# Altium footprint library Connectors THD.PcbLib: 631 footprints (part 40 of 46) (continued)
## TYCO_2-174225-5 [mm] "68 contacts, AMPLIMITE .050\", Right Angled Header  Series 2 Type B (Threaded  M2.5)"
height 9.5
pads (70):
  round 5.5 hole 2.8: 69(-28.955,-0.953) 70(28.955,-0.953)
  round 1.5 hole 0.9: A1(-20.955,2.858) A2(-19.685,0.953) A3(-18.415,2.858) A4(-17.145,0.953) A5(-15.875,2.858) A6(-14.605,0.953) A7(-13.335,2.858) A8(-12.065,0.952) A9(-10.795,2.858) A10(-9.525,0.953) A11(-8.255,2.858) A12(-6.985,0.953) A13(-5.715,2.858) A14(-4.445,0.953) A15(-3.175,2.858) A16(-1.905,0.953) A17(-0.635,2.858) A18(0.635,0.953) A19(1.905,2.858) A20(3.175,0.953) A21(4.445,2.858) A22(5.715,0.953) A23(6.985,2.858) A24(8.255,0.953) A25(9.525,2.858) A26(10.795,0.953) A27(12.065,2.858) A28(13.335,0.953) A29(14.605,2.858) A30(15.875,0.953) A31(17.145,2.858) A32(18.415,0.953) A33(19.685,2.858) A34(20.955,0.953) B1(-20.955,-0.953) B2(-19.685,-2.858) B3(-18.415,-0.953) B4(-17.145,-2.858) B5(-15.875,-0.953) B6(-14.605,-2.858) B7(-13.335,-0.953) B8(-12.065,-2.858) B9(-10.795,-0.953) B10(-9.525,-2.858) B11(-8.255,-0.953) B12(-6.985,-2.858) B13(-5.715,-0.953) B14(-4.445,-2.858) B15(-3.175,-0.953) B16(-1.905,-2.858) B17(-0.635,-0.953) B18(0.635,-2.858) B19(1.905,-0.953) B20(3.175,-2.858) B21(4.445,-0.953) B22(5.715,-2.858) B23(6.985,-0.953) B24(8.255,-2.858) B25(9.525,-0.953) B26(10.795,-2.858) B27(12.065,-0.953) B28(13.335,-2.858) B29(14.605,-0.953) B30(15.875,-2.858) B31(17.145,-0.953) B32(18.415,-2.858) B33(19.685,-0.953) B34(20.955,-2.858)
Top Overlay:
  circle w0.3: c-20.9,4.75 r0.15
  lines w0.2: -31.955,-6.658 -24.69,-6.658 -24.69,-7.658 -31.955,-7.658 -31.955,2.143 cw(c-29.955,2.143) -29.955,4.143 29.955,4.143 cw(c29.955,2.143) 31.955,2.143 31.955,-7.658 24.69,-7.658 24.69,-6.658 31.955,-6.658 ; -31.955,-4.658 31.955,-4.658 ; -26.055,-7.658 -26.055,-11.658 -26.855,-11.658 -26.855,-11.958 -26.055,-13.158 26.055,-13.158 26.855,-11.958 26.855,-11.658 26.055,-11.658 26.055,-7.658 ; -23.14,-4.658 -23.14,-3.5 ; -23.14,3.5 -23.14,4.143 ; -21.455,-13.158 -21.455,-11.158 cw(c-20.955,-11.158) -20.455,-11.158 -20.455,-13.158 ; -23.14,-7.658 -23.14,-6.658 23.14,-6.658 23.14,-7.658 -23.14,-7.658
  text "A34" at 22,0.485 h1
  text "B33" at 22,-1.415 h1
  text "B34" at 22,-3.365 h1
  text "A33" at 22,2.335 h1
  text "B2" at -23.25,-3.25 h1
  text "A1" at -23.25,2.25 h1
  text "A2" at -23.25,0.5 h1
  text "B1" at -23.25,-1.5 h1
Mechanical 8:
  drawing of 284 lines, arcs and shapes, not listed
Mechanical 14:
  drawing of 176 lines, arcs and shapes, not listed
  text "A34" at 22,0.485 h1.02
  text "B33" at 22,-1.415 h1.02
  text "B34" at 22,-3.365 h1.02
  text "A33" at 22,2.335 h1.02
  text "B2" at -23.25,-3.25 h1.02
  text "A1" at -23.25,2.25 h1.02
  text "A2" at -23.25,0.5 h1.02
  text "B1" at -23.25,-1.5 h1.02
3D body: height 9.5, standoff -2.9, extent -31.955,-13.157 31.955,4.143

## TYCO_2-1437506-7 [mm] "HOLTITE Socket (Mating Pin Dia. Range 0.64 to 0.89mm)"
height 3.56
pads (1):
  round 2.1 hole 1.5: 1(0,0)
Mechanical 14:
  circle w0.1: c0,0.006 r0.368
  circle w0.1: c0,0 r0.737
3D body: height 0, standoff -3.45, extent -0.736,-0.736 0.737,0.737

## TYCO_2-5174339-5 [mm] "68 contacts,AMPLIMITE .050 Series II Connector, Through-hole Vertical Plug"
height 9.3
pads (70):
  round 5.5 hole 2.8: 69(-28.956,0) 70(28.956,0)
  round 1.5 hole 0.8: A1(-20.955,2.858) A2(-19.685,0.953) A3(-18.415,2.858) A4(-17.145,0.953) A5(-15.875,2.858) A6(-14.605,0.953) A7(-13.335,2.858) A8(-12.065,0.952) A9(-10.795,2.858) A10(-9.525,0.953) A11(-8.255,2.858) A12(-6.985,0.953) A13(-5.715,2.858) A14(-4.445,0.953) A15(-3.175,2.858) A16(-1.905,0.953) A17(-0.635,2.858) A18(0.635,0.953) A19(1.905,2.858) A20(3.175,0.953) A21(4.445,2.858) A22(5.715,0.953) A23(6.985,2.858) A24(8.255,0.953) A25(9.525,2.858) A26(10.795,0.953) A27(12.065,2.858) A28(13.335,0.953) A29(14.605,2.858) A30(15.875,0.953) A31(17.145,2.858) A32(18.415,0.953) A33(19.685,2.858) A34(20.955,0.953) B1(-20.955,-0.953) B2(-19.685,-2.858) B3(-18.415,-0.953) B4(-17.145,-2.858) B5(-15.875,-0.953) B6(-14.605,-2.858) B7(-13.335,-0.953) B8(-12.065,-2.858) B9(-10.795,-0.953) B10(-9.525,-2.858) B11(-8.255,-0.953) B12(-6.985,-2.858) B13(-5.715,-0.953) B14(-4.445,-2.858) B15(-3.175,-0.953) B16(-1.905,-2.858) B17(-0.635,-0.953) B18(0.635,-2.858) B19(1.905,-0.953) B20(3.175,-2.858) B21(4.445,-0.953) B22(5.715,-2.858) B23(6.985,-0.953) B24(8.255,-2.858) B25(9.525,-0.953) B26(10.795,-2.858) B27(12.065,-0.953) B28(13.335,-2.858) B29(14.605,-0.953) B30(15.875,-2.858) B31(17.145,-0.953) B32(18.415,-2.858) B33(19.685,-0.953) B34(20.955,-2.858)
Top Overlay:
  lines w0.2: -26.855,-2.475 -26.855,-3.65 -20.365,-3.65 ; -26.855,2.475 -26.855,3.65 -21.635,3.65 ; -26.325,-1.55 -26.055,-1.55 ; -26.325,1.55 -26.055,1.55 ; -26.055,-3.65 -26.055,-1 ; -26.055,1 -26.055,3.65 ; -22.005,2.85 -22.04,2.85 ccw(c-22.04,1.75) -23.103,1.465 -22.165,-2.035 ccw(c-21.102,-1.75) -21.102,-2.85 -20.735,-2.85 ; 20.365,3.65 26.855,3.65 26.855,2.475 ; 20.735,2.85 22.04,2.85 cw(c22.04,1.75) 23.103,1.465 22.165,-2.035 cw(c21.102,-1.75) 21.932,-2.472 ; 21.644,-3.65 26.855,-3.65 26.855,-2.475 ; 26.055,-3.65 26.055,-1 ; 26.055,-1.55 26.325,-1.55 ; 26.055,1 26.055,3.65 ; 26.055,1.55 26.325,1.55 ; -31.955,-5.15 31.955,-5.15 31.955,5.15 -31.955,5.15 -31.955,-5.15
  text "B1" at -25.22,-1.508 h1
  text "A2" at -25.22,0.492 h1
  text "A1" at -25.22,2.242 h1
  text "B2" at -25.22,-3.258 h1
  text "A33" at 23.24,2.352 h1
  text "B34" at 23.24,-3.348 h1
  text "B33" at 23.24,-1.398 h1
  text "A34" at 23.24,0.502 h1
Mechanical 8:
  drawing of 284 lines, arcs and shapes, not listed
Mechanical 14:
  drawing of 302 lines, arcs and shapes, not listed
  text "B1" at -25.22,-1.508 h1.02
  text "A2" at -25.22,0.492 h1.02
  text "A1" at -25.22,2.242 h1.02
  text "B2" at -25.22,-3.258 h1.02
  text "A33" at 23.24,2.352 h1.02
  text "B34" at 23.24,-3.348 h1.02
  text "B33" at 23.24,-1.398 h1.02
  text "A34" at 23.24,0.502 h1.02
3D body: height 9.3, standoff -3.1, extent -31.955,-5.15 31.955,5.15

## TYCO_3-794630-4 [mm] "4 Circuits Dual-Row - Vertical Micro MATE-N-LOK Connector"
height 9.24
pads (4):
  round 1.8 hole 1.1: 1(1.5,-1.5) 2(-1.5,-1.5) 3(1.5,1.5) 4(-1.5,1.5)
Top Overlay:
  lines w0.2: -3.86,-1 -3.43,-1 ; -3.86,1 -3.43,1 ; -1.9,-3.43 cw(c-1.9,-3.63) -1.7,-3.63 -1.7,-3.94 -0.45,-3.94 -0.45,-3.63 cw(c-0.25,-3.63) -0.25,-3.43 ; -1.3,3.43 ccw(c-1.3,4.03) -0.7,4.03 -0.7,4.082 ; 0.25,-3.43 cw(c0.25,-3.63) 0.45,-3.63 0.45,-3.94 1.7,-3.94 1.7,-3.63 cw(c1.9,-3.63) 1.9,-3.43 ; 1.3,3.43 cw(c1.3,4.03) 0.7,4.03 0.7,4.082 ; 3.43,-1 3.86,-1 ; 3.43,1 3.86,1 ; -4.55,-1.5 -3.86,-1.5 -3.86,1.5 -4.55,1.5 ; -4.55,-1.5 -5,-0.72 -5,0.72 -4.55,1.5 ; -4.55,-1.5 -4.55,1.5 ; -0.7,4.082 -0.7,4.73 0.7,4.73 0.7,4.082 ; -0.7,4.082 0.7,4.082 ; 4.55,-1.5 3.86,-1.5 3.86,1.5 4.55,1.5 ; 4.55,-1.5 4.55,1.5 ; 4.55,-1.5 5,-0.72 5,0.72 4.55,1.5 ; -3.43,-3.43 -3.43,3.43 3.43,3.43 3.43,-3.43 -3.43,-3.43 ; -2.81,-2.11 -2.81,-0.19 -0.19,-0.19 -0.19,-2.81 -2.11,-2.81 -2.81,-2.11 ; -2.81,0.19 -0.89,0.19 -0.19,0.89 -0.19,2.81 -2.81,2.81 -2.81,0.19 ; 0.19,-2.81 2.11,-2.81 2.81,-2.11 2.81,-0.19 0.19,-0.19 0.19,-2.81 ; 0.19,0.89 0.19,2.81 2.81,2.81 2.81,0.19 0.89,0.19 0.19,0.89
  text "3" at 2.743,3.712 h1.02
  text "4" at -1.575,3.734 h1.02
  text "2" at -2.007,-4.445 h1.02
  text "1" at 3.048,-4.245 h1.02
Mechanical 8:
  lines w0.1: -2.5,-1.5 -1.5,-1.5 ; -2.5,1.5 -1.5,1.5 ; -1.5,-2.5 -1.5,-1.5 ; -1.5,-0.5 -1.5,-1.5 ; -1.5,0.5 -1.5,1.5 ; -1.5,2.5 -1.5,1.5 ; -1,0 0,0 ; -0.5,-1.5 -1.5,-1.5 ; -0.5,1.5 -1.5,1.5 ; 0,-1 0,0 ; 0,1 0,0 ; 0.5,-1.5 1.5,-1.5 ; 0.5,1.5 1.5,1.5 ; 1,0 0,0 ; 1.5,-2.5 1.5,-1.5 ; 1.5,-0.5 1.5,-1.5 ; 1.5,0.5 1.5,1.5 ; 1.5,2.5 1.5,1.5 ; 2.5,-1.5 1.5,-1.5 ; 2.5,1.5 1.5,1.5
Mechanical 14:
  lines w0.1: -3.86,-1 -3.43,-1 ; -3.86,1 -3.43,1 ; -1.9,-3.43 cw(c-1.9,-3.63) -1.7,-3.63 -1.7,-3.94 -0.45,-3.94 -0.45,-3.63 cw(c-0.25,-3.63) -0.25,-3.43 ; -1.3,3.43 ccw(c-1.3,4.03) -0.7,4.03 -0.7,4.082 ; 0.25,-3.43 cw(c0.25,-3.63) 0.45,-3.63 0.45,-3.94 1.7,-3.94 1.7,-3.63 cw(c1.9,-3.63) 1.9,-3.43 ; 1.3,3.43 cw(c1.3,4.03) 0.7,4.03 0.7,4.082 ; 3.43,-1 3.86,-1 ; 3.43,1 3.86,1 ; -4.55,-1.5 -3.86,-1.5 -3.86,1.5 -4.55,1.5 ; -4.55,-1.5 -5,-0.72 -5,0.72 -4.55,1.5 ; -4.55,-1.5 -4.55,1.5 ; -0.7,4.082 -0.7,4.73 0.7,4.73 0.7,4.082 ; -0.7,4.082 0.7,4.082 ; 4.55,-1.5 3.86,-1.5 3.86,1.5 4.55,1.5 ; 4.55,-1.5 4.55,1.5 ; 4.55,-1.5 5,-0.72 5,0.72 4.55,1.5 ; -3.43,-3.43 -3.43,3.43 3.43,3.43 3.43,-3.43 -3.43,-3.43 ; -2.81,-2.11 -2.81,-0.19 -0.19,-0.19 -0.19,-2.81 -2.11,-2.81 -2.81,-2.11 ; -2.81,0.19 -0.89,0.19 -0.19,0.89 -0.19,2.81 -2.81,2.81 -2.81,0.19 ; 0.19,-2.81 2.11,-2.81 2.81,-2.11 2.81,-0.19 0.19,-0.19 0.19,-2.81 ; 0.19,0.89 0.19,2.81 2.81,2.81 2.81,0.19 0.89,0.19 0.19,0.89
  text "3" at 2.743,3.712 h1.02
  text "4" at -1.575,3.734 h1.02
  text "2" at -2.007,-4.445 h1.02
  text "1" at 3.048,-4.245 h1.02
3D body: height 9.24, standoff -3.18, extent -5,-3.94 5,4.73

## TYCO_3-794630-8 [mm] "8 Circuits Dual-Row - Vertical Micro MATE-N-LOK Connector"
height 9.24
pads (8):
  round 1.8 hole 1.1: 1(4.5,-1.5) 2(1.5,-1.5) 3(-1.5,-1.5) 4(-4.5,-1.5) 5(4.5,1.5) 6(1.5,1.5) 7(-1.5,1.5) 8(-4.5,1.5)
Top Overlay:
  lines w0.2: -6.86,-1 -6.43,-1 ; -6.86,1 -6.43,1 ; -4.25,-3.43 cw(c-4.25,-3.63) -4.05,-3.63 -4.05,-3.94 -2.8,-3.94 -2.8,-3.63 cw(c-2.6,-3.63) -2.6,-3.43 ; -1.3,3.43 ccw(c-1.3,4.03) -0.7,4.03 -0.7,4.082 ; 1.3,3.43 cw(c1.3,4.03) 0.7,4.03 0.7,4.082 ; 2.6,-3.43 cw(c2.6,-3.63) 2.8,-3.63 2.8,-3.94 4.05,-3.94 4.05,-3.63 cw(c4.25,-3.63) 4.25,-3.43 ; 6.43,-1 6.86,-1 ; 6.43,1 6.86,1 ; -7.55,-1.5 -7.55,1.5 ; -7.55,-1.5 -8,-0.72 -8,0.72 -7.55,1.5 ; -7.55,-1.5 -6.86,-1.5 -6.86,1.5 -7.55,1.5 ; -0.7,4.082 0.7,4.082 ; -0.7,4.082 -0.7,4.73 0.7,4.73 0.7,4.082 ; 7.55,-1.5 8,-0.72 8,0.72 7.55,1.5 ; 7.55,-1.5 7.55,1.5 ; 7.55,-1.5 6.86,-1.5 6.86,1.5 7.55,1.5 ; -6.43,-3.43 6.43,-3.43 6.43,3.43 -6.43,3.43 -6.43,-3.43 ; -5.81,-2.81 -5.81,-0.19 -3.19,-0.19 -3.19,-2.11 -3.89,-2.81 -5.81,-2.81 ; -5.81,0.19 -5.81,2.81 -3.19,2.81 -3.19,0.19 -5.81,0.19 ; -2.81,-2.11 -2.11,-2.81 -0.19,-2.81 -0.19,-0.19 -2.81,-0.19 -2.81,-2.11 ; -2.81,0.89 -2.11,0.19 -0.19,0.19 -0.19,2.81 -2.81,2.81 -2.81,0.89 ; 0.19,-2.81 0.19,-0.19 2.81,-0.19 2.81,-2.11 2.11,-2.81 0.19,-2.81 ; 0.19,0.19 0.19,2.81 2.81,2.81 2.81,0.89 2.11,0.19 0.19,0.19 ; 3.19,-2.11 3.89,-2.81 5.81,-2.81 5.81,-0.19 3.19,-0.19 3.19,-2.11 ; 3.19,0.89 3.89,0.19 5.81,0.19 5.81,2.81 3.19,2.81 3.19,0.89
  text "1" at 5.588,-4.245 h1.02
  text "4" at -4.445,-4.445 h1.02
  text "8" at -4.064,3.71 h1.02
  text "5" at 4.902,3.739 h1.02
  text "6" at 2.362,3.685 h1.02
  text "7" at -1.448,3.685 h1.02
  text "2" at 2.032,-4.445 h1.02
  text "3" at -0.889,-4.445 h1.02
Mechanical 8:
  lines w0.1: -5.5,-1.5 -4.5,-1.5 ; -5.5,1.5 -4.5,1.5 ; -4.5,-2.5 -4.5,-1.5 ; -4.5,-0.5 -4.5,-1.5 ; -4.5,0.5 -4.5,1.5 ; -4.5,2.5 -4.5,1.5 ; -3.5,-1.5 -4.5,-1.5 ; -3.5,1.5 -4.5,1.5 ; -2.5,-1.5 -1.5,-1.5 ; -2.5,1.5 -1.5,1.5 ; -1.5,-2.5 -1.5,-1.5 ; -1.5,-0.5 -1.5,-1.5 ; -1.5,0.5 -1.5,1.5 ; -1.5,2.5 -1.5,1.5 ; -1,0 0,0 ; -0.5,-1.5 -1.5,-1.5 ; -0.5,1.5 -1.5,1.5 ; 0,-1 0,0 ; 0,1 0,0 ; 0.5,-1.5 1.5,-1.5 ; 0.5,1.5 1.5,1.5 ; 1,0 0,0 ; 1.5,-2.5 1.5,-1.5 ; 1.5,-0.5 1.5,-1.5 ; 1.5,0.5 1.5,1.5 ; 1.5,2.5 1.5,1.5 ; 2.5,-1.5 1.5,-1.5 ; 2.5,1.5 1.5,1.5 ; 3.5,-1.5 4.5,-1.5 ; 3.5,1.5 4.5,1.5 ; 4.5,-2.5 4.5,-1.5 ; 4.5,-0.5 4.5,-1.5 ; 4.5,0.5 4.5,1.5 ; 4.5,2.5 4.5,1.5 ; 5.5,-1.5 4.5,-1.5 ; 5.5,1.5 4.5,1.5
Mechanical 14:
  lines w0.1: -6.86,-1 -6.43,-1 ; -6.86,1 -6.43,1 ; -4.25,-3.43 cw(c-4.25,-3.63) -4.05,-3.63 -4.05,-3.94 -2.8,-3.94 -2.8,-3.63 cw(c-2.6,-3.63) -2.6,-3.43 ; -1.3,3.43 ccw(c-1.3,4.03) -0.7,4.03 -0.7,4.082 ; 1.3,3.43 cw(c1.3,4.03) 0.7,4.03 0.7,4.082 ; 2.6,-3.43 cw(c2.6,-3.63) 2.8,-3.63 2.8,-3.94 4.05,-3.94 4.05,-3.63 cw(c4.25,-3.63) 4.25,-3.43 ; 6.43,-1 6.86,-1 ; 6.43,1 6.86,1 ; -7.55,-1.5 -7.55,1.5 ; -7.55,-1.5 -8,-0.72 -8,0.72 -7.55,1.5 ; -7.55,-1.5 -6.86,-1.5 -6.86,1.5 -7.55,1.5 ; -0.7,4.082 0.7,4.082 ; -0.7,4.082 -0.7,4.73 0.7,4.73 0.7,4.082 ; 7.55,-1.5 8,-0.72 8,0.72 7.55,1.5 ; 7.55,-1.5 7.55,1.5 ; 7.55,-1.5 6.86,-1.5 6.86,1.5 7.55,1.5 ; -6.43,-3.43 6.43,-3.43 6.43,3.43 -6.43,3.43 -6.43,-3.43 ; -5.81,-2.81 -5.81,-0.19 -3.19,-0.19 -3.19,-2.11 -3.89,-2.81 -5.81,-2.81 ; -5.81,0.19 -5.81,2.81 -3.19,2.81 -3.19,0.19 -5.81,0.19 ; -2.81,-2.11 -2.11,-2.81 -0.19,-2.81 -0.19,-0.19 -2.81,-0.19 -2.81,-2.11 ; -2.81,0.89 -2.11,0.19 -0.19,0.19 -0.19,2.81 -2.81,2.81 -2.81,0.89 ; 0.19,-2.81 0.19,-0.19 2.81,-0.19 2.81,-2.11 2.11,-2.81 0.19,-2.81 ; 0.19,0.19 0.19,2.81 2.81,2.81 2.81,0.89 2.11,0.19 0.19,0.19 ; 3.19,-2.11 3.89,-2.81 5.81,-2.81 5.81,-0.19 3.19,-0.19 3.19,-2.11 ; 3.19,0.89 3.89,0.19 5.81,0.19 5.81,2.81 3.19,2.81 3.19,0.89
  text "1" at 5.588,-4.245 h1.02
  text "4" at -4.445,-4.445 h1.02
  text "8" at -4.064,3.71 h1.02
  text "5" at 4.902,3.739 h1.02
  text "6" at 2.362,3.685 h1.02
  text "7" at -1.448,3.685 h1.02
  text "2" at 2.032,-4.445 h1.02
  text "3" at -0.889,-4.445 h1.02
3D body: height 9.24, standoff -3.18, extent -8,-3.94 8,4.73

## TYCO_3-794631-4 [mm] "4 Circuits Dual-Row - Vertical Micro MATE-N-LOK Connector - Gold Contact Plating"
height 9.24
pads (4):
  round 1.8 hole 1.1: 1(1.5,-1.5) 2(-1.5,-1.5) 3(1.5,1.5) 4(-1.5,1.5)
Top Overlay:
  lines w0.2: -3.86,-1 -3.43,-1 ; -3.86,1 -3.43,1 ; -1.9,-3.43 cw(c-1.9,-3.63) -1.7,-3.63 -1.7,-3.94 -0.45,-3.94 -0.45,-3.63 cw(c-0.25,-3.63) -0.25,-3.43 ; -1.3,3.43 ccw(c-1.3,4.03) -0.7,4.03 -0.7,4.082 ; 0.25,-3.43 cw(c0.25,-3.63) 0.45,-3.63 0.45,-3.94 1.7,-3.94 1.7,-3.63 cw(c1.9,-3.63) 1.9,-3.43 ; 1.3,3.43 cw(c1.3,4.03) 0.7,4.03 0.7,4.082 ; 3.43,-1 3.86,-1 ; 3.43,1 3.86,1 ; -4.55,-1.5 -3.86,-1.5 -3.86,1.5 -4.55,1.5 ; -4.55,-1.5 -5,-0.72 -5,0.72 -4.55,1.5 ; -4.55,-1.5 -4.55,1.5 ; -0.7,4.082 -0.7,4.73 0.7,4.73 0.7,4.082 ; -0.7,4.082 0.7,4.082 ; 4.55,-1.5 3.86,-1.5 3.86,1.5 4.55,1.5 ; 4.55,-1.5 4.55,1.5 ; 4.55,-1.5 5,-0.72 5,0.72 4.55,1.5 ; -3.43,-3.43 -3.43,3.43 3.43,3.43 3.43,-3.43 -3.43,-3.43 ; -2.81,-2.11 -2.81,-0.19 -0.19,-0.19 -0.19,-2.81 -2.11,-2.81 -2.81,-2.11 ; -2.81,0.19 -0.89,0.19 -0.19,0.89 -0.19,2.81 -2.81,2.81 -2.81,0.19 ; 0.19,-2.81 2.11,-2.81 2.81,-2.11 2.81,-0.19 0.19,-0.19 0.19,-2.81 ; 0.19,0.89 0.19,2.81 2.81,2.81 2.81,0.19 0.89,0.19 0.19,0.89
  text "3" at 2.743,3.712 h1.02
  text "4" at -1.575,3.734 h1.02
  text "2" at -2.007,-4.445 h1.02
  text "1" at 3.048,-4.245 h1.02
Mechanical 8:
  lines w0.1: -2.5,-1.5 -1.5,-1.5 ; -2.5,1.5 -1.5,1.5 ; -1.5,-2.5 -1.5,-1.5 ; -1.5,-0.5 -1.5,-1.5 ; -1.5,0.5 -1.5,1.5 ; -1.5,2.5 -1.5,1.5 ; -1,0 0,0 ; -0.5,-1.5 -1.5,-1.5 ; -0.5,1.5 -1.5,1.5 ; 0,-1 0,0 ; 0,1 0,0 ; 0.5,-1.5 1.5,-1.5 ; 0.5,1.5 1.5,1.5 ; 1,0 0,0 ; 1.5,-2.5 1.5,-1.5 ; 1.5,-0.5 1.5,-1.5 ; 1.5,0.5 1.5,1.5 ; 1.5,2.5 1.5,1.5 ; 2.5,-1.5 1.5,-1.5 ; 2.5,1.5 1.5,1.5
Mechanical 14:
  lines w0.1: -3.86,-1 -3.43,-1 ; -3.86,1 -3.43,1 ; -1.9,-3.43 cw(c-1.9,-3.63) -1.7,-3.63 -1.7,-3.94 -0.45,-3.94 -0.45,-3.63 cw(c-0.25,-3.63) -0.25,-3.43 ; -1.3,3.43 ccw(c-1.3,4.03) -0.7,4.03 -0.7,4.082 ; 0.25,-3.43 cw(c0.25,-3.63) 0.45,-3.63 0.45,-3.94 1.7,-3.94 1.7,-3.63 cw(c1.9,-3.63) 1.9,-3.43 ; 1.3,3.43 cw(c1.3,4.03) 0.7,4.03 0.7,4.082 ; 3.43,-1 3.86,-1 ; 3.43,1 3.86,1 ; -4.55,-1.5 -3.86,-1.5 -3.86,1.5 -4.55,1.5 ; -4.55,-1.5 -5,-0.72 -5,0.72 -4.55,1.5 ; -4.55,-1.5 -4.55,1.5 ; -0.7,4.082 -0.7,4.73 0.7,4.73 0.7,4.082 ; -0.7,4.082 0.7,4.082 ; 4.55,-1.5 3.86,-1.5 3.86,1.5 4.55,1.5 ; 4.55,-1.5 4.55,1.5 ; 4.55,-1.5 5,-0.72 5,0.72 4.55,1.5 ; -3.43,-3.43 -3.43,3.43 3.43,3.43 3.43,-3.43 -3.43,-3.43 ; -2.81,-2.11 -2.81,-0.19 -0.19,-0.19 -0.19,-2.81 -2.11,-2.81 -2.81,-2.11 ; -2.81,0.19 -0.89,0.19 -0.19,0.89 -0.19,2.81 -2.81,2.81 -2.81,0.19 ; 0.19,-2.81 2.11,-2.81 2.81,-2.11 2.81,-0.19 0.19,-0.19 0.19,-2.81 ; 0.19,0.89 0.19,2.81 2.81,2.81 2.81,0.19 0.89,0.19 0.19,0.89
  text "3" at 2.743,3.712 h1.02
  text "4" at -1.575,3.734 h1.02
  text "2" at -2.007,-4.445 h1.02
  text "1" at 3.048,-4.245 h1.02
3D body: height 9.24, standoff -3.18, extent -5,-3.94 5,4.73

## TYCO_3-794631-8 [mm] "8 Circuits Dual-Row - Vertical Micro MATE-N-LOK Connector - Gold Contact Plating"
height 9.24
pads (8):
  round 1.8 hole 1.1: 1(4.5,-1.5) 2(1.5,-1.5) 3(-1.5,-1.5) 4(-4.5,-1.5) 5(4.5,1.5) 6(1.5,1.5) 7(-1.5,1.5) 8(-4.5,1.5)
Top Overlay:
  lines w0.2: -6.86,-1 -6.43,-1 ; -6.86,1 -6.43,1 ; -4.25,-3.43 cw(c-4.25,-3.63) -4.05,-3.63 -4.05,-3.94 -2.8,-3.94 -2.8,-3.63 cw(c-2.6,-3.63) -2.6,-3.43 ; -1.3,3.43 ccw(c-1.3,4.03) -0.7,4.03 -0.7,4.082 ; 1.3,3.43 cw(c1.3,4.03) 0.7,4.03 0.7,4.082 ; 2.6,-3.43 cw(c2.6,-3.63) 2.8,-3.63 2.8,-3.94 4.05,-3.94 4.05,-3.63 cw(c4.25,-3.63) 4.25,-3.43 ; 6.43,-1 6.86,-1 ; 6.43,1 6.86,1 ; -7.55,-1.5 -7.55,1.5 ; -7.55,-1.5 -8,-0.72 -8,0.72 -7.55,1.5 ; -7.55,-1.5 -6.86,-1.5 -6.86,1.5 -7.55,1.5 ; -0.7,4.082 0.7,4.082 ; -0.7,4.082 -0.7,4.73 0.7,4.73 0.7,4.082 ; 7.55,-1.5 8,-0.72 8,0.72 7.55,1.5 ; 7.55,-1.5 7.55,1.5 ; 7.55,-1.5 6.86,-1.5 6.86,1.5 7.55,1.5 ; -6.43,-3.43 6.43,-3.43 6.43,3.43 -6.43,3.43 -6.43,-3.43 ; -5.81,-2.81 -5.81,-0.19 -3.19,-0.19 -3.19,-2.11 -3.89,-2.81 -5.81,-2.81 ; -5.81,0.19 -5.81,2.81 -3.19,2.81 -3.19,0.19 -5.81,0.19 ; -2.81,-2.11 -2.11,-2.81 -0.19,-2.81 -0.19,-0.19 -2.81,-0.19 -2.81,-2.11 ; -2.81,0.89 -2.11,0.19 -0.19,0.19 -0.19,2.81 -2.81,2.81 -2.81,0.89 ; 0.19,-2.81 0.19,-0.19 2.81,-0.19 2.81,-2.11 2.11,-2.81 0.19,-2.81 ; 0.19,0.19 0.19,2.81 2.81,2.81 2.81,0.89 2.11,0.19 0.19,0.19 ; 3.19,-2.11 3.89,-2.81 5.81,-2.81 5.81,-0.19 3.19,-0.19 3.19,-2.11 ; 3.19,0.89 3.89,0.19 5.81,0.19 5.81,2.81 3.19,2.81 3.19,0.89
  text "1" at 5.588,-4.245 h1.02
  text "4" at -4.445,-4.445 h1.02
  text "8" at -4.064,3.71 h1.02
  text "5" at 4.902,3.739 h1.02
  text "6" at 2.362,3.685 h1.02
  text "7" at -1.448,3.685 h1.02
  text "2" at 2.032,-4.445 h1.02
  text "3" at -0.889,-4.445 h1.02
Mechanical 8:
  lines w0.1: -5.5,-1.5 -4.5,-1.5 ; -5.5,1.5 -4.5,1.5 ; -4.5,-2.5 -4.5,-1.5 ; -4.5,-0.5 -4.5,-1.5 ; -4.5,0.5 -4.5,1.5 ; -4.5,2.5 -4.5,1.5 ; -3.5,-1.5 -4.5,-1.5 ; -3.5,1.5 -4.5,1.5 ; -2.5,-1.5 -1.5,-1.5 ; -2.5,1.5 -1.5,1.5 ; -1.5,-2.5 -1.5,-1.5 ; -1.5,-0.5 -1.5,-1.5 ; -1.5,0.5 -1.5,1.5 ; -1.5,2.5 -1.5,1.5 ; -1,0 0,0 ; -0.5,-1.5 -1.5,-1.5 ; -0.5,1.5 -1.5,1.5 ; 0,-1 0,0 ; 0,1 0,0 ; 0.5,-1.5 1.5,-1.5 ; 0.5,1.5 1.5,1.5 ; 1,0 0,0 ; 1.5,-2.5 1.5,-1.5 ; 1.5,-0.5 1.5,-1.5 ; 1.5,0.5 1.5,1.5 ; 1.5,2.5 1.5,1.5 ; 2.5,-1.5 1.5,-1.5 ; 2.5,1.5 1.5,1.5 ; 3.5,-1.5 4.5,-1.5 ; 3.5,1.5 4.5,1.5 ; 4.5,-2.5 4.5,-1.5 ; 4.5,-0.5 4.5,-1.5 ; 4.5,0.5 4.5,1.5 ; 4.5,2.5 4.5,1.5 ; 5.5,-1.5 4.5,-1.5 ; 5.5,1.5 4.5,1.5
Mechanical 14:
  lines w0.1: -6.86,-1 -6.43,-1 ; -6.86,1 -6.43,1 ; -4.25,-3.43 cw(c-4.25,-3.63) -4.05,-3.63 -4.05,-3.94 -2.8,-3.94 -2.8,-3.63 cw(c-2.6,-3.63) -2.6,-3.43 ; -1.3,3.43 ccw(c-1.3,4.03) -0.7,4.03 -0.7,4.082 ; 1.3,3.43 cw(c1.3,4.03) 0.7,4.03 0.7,4.082 ; 2.6,-3.43 cw(c2.6,-3.63) 2.8,-3.63 2.8,-3.94 4.05,-3.94 4.05,-3.63 cw(c4.25,-3.63) 4.25,-3.43 ; 6.43,-1 6.86,-1 ; 6.43,1 6.86,1 ; -7.55,-1.5 -7.55,1.5 ; -7.55,-1.5 -8,-0.72 -8,0.72 -7.55,1.5 ; -7.55,-1.5 -6.86,-1.5 -6.86,1.5 -7.55,1.5 ; -0.7,4.082 0.7,4.082 ; -0.7,4.082 -0.7,4.73 0.7,4.73 0.7,4.082 ; 7.55,-1.5 8,-0.72 8,0.72 7.55,1.5 ; 7.55,-1.5 7.55,1.5 ; 7.55,-1.5 6.86,-1.5 6.86,1.5 7.55,1.5 ; -6.43,-3.43 6.43,-3.43 6.43,3.43 -6.43,3.43 -6.43,-3.43 ; -5.81,-2.81 -5.81,-0.19 -3.19,-0.19 -3.19,-2.11 -3.89,-2.81 -5.81,-2.81 ; -5.81,0.19 -5.81,2.81 -3.19,2.81 -3.19,0.19 -5.81,0.19 ; -2.81,-2.11 -2.11,-2.81 -0.19,-2.81 -0.19,-0.19 -2.81,-0.19 -2.81,-2.11 ; -2.81,0.89 -2.11,0.19 -0.19,0.19 -0.19,2.81 -2.81,2.81 -2.81,0.89 ; 0.19,-2.81 0.19,-0.19 2.81,-0.19 2.81,-2.11 2.11,-2.81 0.19,-2.81 ; 0.19,0.19 0.19,2.81 2.81,2.81 2.81,0.89 2.11,0.19 0.19,0.19 ; 3.19,-2.11 3.89,-2.81 5.81,-2.81 5.81,-0.19 3.19,-0.19 3.19,-2.11 ; 3.19,0.89 3.89,0.19 5.81,0.19 5.81,2.81 3.19,2.81 3.19,0.89
  text "1" at 5.588,-4.245 h1.02
  text "4" at -4.445,-4.445 h1.02
  text "8" at -4.064,3.71 h1.02
  text "5" at 4.902,3.739 h1.02
  text "6" at 2.362,3.685 h1.02
  text "7" at -1.448,3.685 h1.02
  text "2" at 2.032,-4.445 h1.02
  text "3" at -0.889,-4.445 h1.02
3D body: height 9.24, standoff -3.18, extent -8,-3.94 8,4.73

## TYCO_3-1634221-2 [mm] "Straight D-SUB 37 Male Contacts for PCB  with Harpoons and Female Screwlock (UNC4-40)"
height 12.6
pads (39):
  round 1.6 hole 1: 1(-24.93,1.42) 2(-22.16,1.42) 3(-19.39,1.42) 4(-16.62,1.42) 5(-13.85,1.42) 6(-11.08,1.42) 7(-8.31,1.42) 8(-5.54,1.42) 9(-2.77,1.42) 10(0,1.42) 11(2.77,1.42) 12(5.54,1.42) 13(8.31,1.42) 14(11.08,1.42) 15(13.85,1.42) 16(16.62,1.42) 17(19.39,1.42) 18(22.16,1.42) 19(24.93,1.42) 20(-23.545,-1.42) 21(-20.775,-1.42) 22(-18.005,-1.42) 23(-15.235,-1.42) 24(-12.465,-1.42) 25(-9.695,-1.42) 26(-6.925,-1.42) 27(-4.155,-1.42) 28(-1.385,-1.42) 29(1.385,-1.42) 30(4.155,-1.42) 31(6.925,-1.42) 32(9.695,-1.42) 33(12.465,-1.42) 34(15.235,-1.42) 35(18.005,-1.42) 36(20.775,-1.42) 37(23.545,-1.42)
  round 5.5 hole 3.1: 38(31.755,0) 39(-31.755,0)
Top Overlay:
  circle w0.5: c24.93,7.42 r0.25
  lines w0.2: -34.7,-4.675 ccw(c-33.1,-4.675) -33.1,-6.275 33.1,-6.275 ccw(c33.1,-4.675) 34.7,-4.675 34.7,4.675 ccw(c33.1,4.675) 33.1,6.275 -33.1,6.275 ccw(c-33.1,4.675) -34.7,4.675 -34.7,-4.675 ; -27.776,0.946 cw(c-24.92,1.45) -24.92,4.35 24.92,4.35 cw(c24.92,1.45) 27.776,0.946 27.265,-1.954 cw(c24.409,-1.45) 24.409,-4.35 -24.409,-4.35 cw(c-24.409,-1.45) -27.265,-1.954 -27.776,0.946 ; -27.382,1.016 cw(c-24.92,1.45) -24.92,3.95 24.92,3.95 cw(c24.92,1.45) 27.382,1.016 26.871,-1.884 cw(c24.409,-1.45) 24.409,-3.95 -24.409,-3.95 cw(c-24.409,-1.45) -26.871,-1.884 -27.382,1.016
  text "19" at 26.543,4.318 h1.2
  text "1" at -27,4.318 h1.2
  text "20" at -28.27,-5.842 h1.2
  text "37" at 26.059,-5.715 h1.2
Mechanical 8:
  drawing of 160 lines, arcs and shapes, not listed
Mechanical 14:
  circle w0.1: c31.755,0 r1.422
  circle w0.1: c-31.755,0 r1.422
  circle w0.1: c24.93,1.42 r0.5
  circle w0.1: c-24.93,1.42 r0.5
  circle w0.1: c-23.545,-1.42 r0.5
  circle w0.1: c-20.775,-1.42 r0.5
  circle w0.1: c-18.005,-1.42 r0.5
  circle w0.1: c-13.85,1.42 r0.5
  circle w0.1: c-12.465,-1.42 r0.5
  circle w0.1: c-8.31,1.42 r0.5
  circle w0.1: c-6.925,-1.42 r0.5
  circle w0.1: c-4.155,-1.42 r0.5
  circle w0.1: c-1.385,-1.42 r0.5
  circle w0.1: c2.77,1.42 r0.5
  circle w0.1: c8.31,1.42 r0.5
  circle w0.1: c13.85,1.42 r0.5
  circle w0.1: c19.39,1.42 r0.5
  circle w0.1: c4.155,-1.42 r0.5
  circle w0.1: c9.695,-1.42 r0.5
  circle w0.1: c15.235,-1.42 r0.5
  circle w0.1: c20.775,-1.42 r0.5
  circle w0.1: c23.545,-1.42 r0.5
  circle w0.1: c18.005,-1.42 r0.5
  circle w0.1: c12.465,-1.42 r0.5
  circle w0.1: c6.925,-1.42 r0.5
  circle w0.1: c22.16,1.42 r0.5
  circle w0.1: c16.62,1.42 r0.5
  circle w0.1: c11.08,1.42 r0.5
  circle w0.1: c5.54,1.42 r0.5
  circle w0.1: c1.385,-1.42 r0.5
  circle w0.1: c0,1.42 r0.5
  circle w0.1: c-2.77,1.42 r0.5
  circle w0.1: c-5.54,1.42 r0.5
  circle w0.1: c-9.695,-1.42 r0.5
  circle w0.1: c-11.08,1.42 r0.5
  circle w0.1: c-15.235,-1.42 r0.5
  circle w0.1: c-16.62,1.42 r0.5
  circle w0.1: c-19.39,1.42 r0.5
  circle w0.1: c-22.16,1.42 r0.5
  lines w0.1: -34.7,-4.675 ccw(c-33.1,-4.675) -33.1,-6.275 33.1,-6.275 ccw(c33.1,-4.675) 34.7,-4.675 34.7,4.675 ccw(c33.1,4.675) 33.1,6.275 -33.1,6.275 ccw(c-33.1,4.675) -34.7,4.675 -34.7,-4.675 ; -34.497,0 -33.126,-2.375 -30.384,-2.375 -29.013,0 -30.384,2.375 -33.126,2.375 -34.497,0 ; -27.776,0.946 cw(c-24.92,1.45) -24.92,4.35 24.92,4.35 cw(c24.92,1.45) 27.776,0.946 27.265,-1.954 cw(c24.409,-1.45) 24.409,-4.35 -24.409,-4.35 cw(c-24.409,-1.45) -27.265,-1.954 -27.776,0.946 ; -27.382,1.016 cw(c-24.92,1.45) -24.92,3.95 24.92,3.95 cw(c24.92,1.45) 27.382,1.016 26.871,-1.884 cw(c24.409,-1.45) 24.409,-3.95 -24.409,-3.95 cw(c-24.409,-1.45) -26.871,-1.884 -27.382,1.016 ; 29.013,0 30.384,-2.375 33.126,-2.375 34.497,0 33.126,2.375 30.384,2.375 29.013,0
  text "19" at 26.543,4.318 h1.5
  text "1" at -27,4.318 h1.5
  text "20" at -28.27,-5.842 h1.5
  text "37" at 26.059,-5.715 h1.5
  text "37 D-Sub Male" at -8.128,4.572 h1.5
3D body: height 12.6, standoff -4.5, extent -34.7,-6.275 34.7,6.275

## TYCO_3-1634225-2 [mm] "Straight D-SUB 37 Female Contacts for PCB  with Harpoons and Female Screwlock (UNC4-40)"
height 12.15
pads (39):
  round 1.6 hole 1: 1(24.93,1.42) 2(22.16,1.42) 3(19.39,1.42) 4(16.62,1.42) 5(13.85,1.42) 6(11.08,1.42) 7(8.31,1.42) 8(5.54,1.42) 9(2.77,1.42) 10(0,1.42) 11(-2.77,1.42) 12(-5.54,1.42) 13(-8.31,1.42) 14(-11.08,1.42) 15(-13.85,1.42) 16(-16.62,1.42) 17(-19.39,1.42) 18(-22.16,1.42) 19(-24.93,1.42) 20(23.545,-1.42) 21(20.775,-1.42) 22(18.005,-1.42) 23(15.235,-1.42) 24(12.465,-1.42) 25(9.695,-1.42) 26(6.925,-1.42) 27(4.155,-1.42) 28(1.385,-1.42) 29(-1.385,-1.42) 30(-4.155,-1.42) 31(-6.925,-1.42) 32(-9.695,-1.42) 33(-12.465,-1.42) 34(-15.235,-1.42) 35(-18.005,-1.42) 36(-20.775,-1.42) 37(-23.545,-1.42)
  round 5.5 hole 3.1: 38(31.755,0) 39(-31.755,0)
Top Overlay:
  circle w0.5: c24.93,7.42 r0.25
  lines w0.2: -34.7,-4.675 ccw(c-33.1,-4.675) -33.1,-6.275 33.1,-6.275 ccw(c33.1,-4.675) 34.7,-4.675 34.7,4.675 ccw(c33.1,4.675) 33.1,6.275 -33.1,6.275 ccw(c-33.1,4.675) -34.7,4.675 -34.7,-4.675 ; -27.382,1.016 cw(c-24.92,1.45) -24.92,3.95 24.92,3.95 cw(c24.92,1.45) 27.382,1.016 26.871,-1.884 cw(c24.409,-1.45) 24.409,-3.95 -24.409,-3.95 cw(c-24.409,-1.45) -26.871,-1.884 -27.382,1.016 ; -26.988,1.085 cw(c-24.92,1.45) -24.92,3.55 24.92,3.55 cw(c24.92,1.45) 26.988,1.085 26.477,-1.815 cw(c24.409,-1.45) 24.409,-3.55 -24.409,-3.55 cw(c-24.409,-1.45) -26.477,-1.815 -26.988,1.085
  text "20" at 22.249,-5.842 h1.2
  text "37" at -24.841,-5.842 h1.2
  text "19" at -25.984,4.445 h1.2
  text "1" at 24.765,4.445 h1.2
Mechanical 8:
  drawing of 160 lines, arcs and shapes, not listed
Mechanical 14:
  circle w0.1: c-22.16,1.42 r0.5
  circle w0.1: c-19.39,1.42 r0.5
  circle w0.1: c-16.62,1.42 r0.5
  circle w0.1: c-15.235,-1.42 r0.5
  circle w0.1: c-11.08,1.42 r0.5
  circle w0.1: c-9.695,-1.42 r0.5
  circle w0.1: c-5.54,1.42 r0.5
  circle w0.1: c-2.77,1.42 r0.5
  circle w0.1: c0,1.42 r0.5
  circle w0.1: c1.385,-1.42 r0.5
  circle w0.1: c5.54,1.42 r0.5
  circle w0.1: c11.08,1.42 r0.5
  circle w0.1: c16.62,1.42 r0.5
  circle w0.1: c22.16,1.42 r0.5
  circle w0.1: c6.925,-1.42 r0.5
  circle w0.1: c12.465,-1.42 r0.5
  circle w0.1: c18.005,-1.42 r0.5
  circle w0.1: c23.545,-1.42 r0.5
  circle w0.1: c20.775,-1.42 r0.5
  circle w0.1: c15.235,-1.42 r0.5
  circle w0.1: c9.695,-1.42 r0.5
  circle w0.1: c4.155,-1.42 r0.5
  circle w0.1: c19.39,1.42 r0.5
  circle w0.1: c13.85,1.42 r0.5
  circle w0.1: c8.31,1.42 r0.5
  circle w0.1: c2.77,1.42 r0.5
  circle w0.1: c-1.385,-1.42 r0.5
  circle w0.1: c-4.155,-1.42 r0.5
  circle w0.1: c-6.925,-1.42 r0.5
  circle w0.1: c-8.31,1.42 r0.5
  circle w0.1: c-12.465,-1.42 r0.5
  circle w0.1: c-13.85,1.42 r0.5
  circle w0.1: c-18.005,-1.42 r0.5
  circle w0.1: c-20.775,-1.42 r0.5
  circle w0.1: c-23.545,-1.42 r0.5
  circle w0.1: c-24.93,1.42 r0.5
  circle w0.1: c24.93,1.42 r0.5
  circle w0.1: c-31.755,0 r1.422
  circle w0.1: c31.755,0 r1.422
  lines w0.1: -34.7,-4.675 ccw(c-33.1,-4.675) -33.1,-6.275 33.1,-6.275 ccw(c33.1,-4.675) 34.7,-4.675 34.7,4.675 ccw(c33.1,4.675) 33.1,6.275 -33.1,6.275 ccw(c-33.1,4.675) -34.7,4.675 -34.7,-4.675 ; -34.497,0 -33.126,2.375 -30.384,2.375 -29.013,0 -30.384,-2.375 -33.126,-2.375 -34.497,0 ; -27.382,1.016 cw(c-24.92,1.45) -24.92,3.95 24.92,3.95 cw(c24.92,1.45) 27.382,1.016 26.871,-1.884 cw(c24.409,-1.45) 24.409,-3.95 -24.409,-3.95 cw(c-24.409,-1.45) -26.871,-1.884 -27.382,1.016 ; -26.988,1.085 cw(c-24.92,1.45) -24.92,3.55 24.92,3.55 cw(c24.92,1.45) 26.988,1.085 26.477,-1.815 cw(c24.409,-1.45) 24.409,-3.55 -24.409,-3.55 cw(c-24.409,-1.45) -26.477,-1.815 -26.988,1.085 ; 29.013,0 30.384,2.375 33.126,2.375 34.497,0 33.126,-2.375 30.384,-2.375 29.013,0
  text "37 D-Sub Female" at -9.525,4.318 h1.5
  text "20" at 22.249,-5.842 h1.5
  text "37" at -24.841,-5.842 h1.5
  text "19" at -25.984,4.445 h1.5
  text "1" at 24.765,4.445 h1.5
3D body: height 12.5, standoff -4.5, extent -34.7,-6.275 34.7,6.275